# Altium footprint library NASCO 3D PCBLIB.PcbLib: 108 footprints (part 7 of 7)
Each footprint in its own frame and in the unit in brackets; x right, y up, seen from the top. Pads: shape width x height; smd on the part's side, far side on the other; paste and mask are expansions set on the pad; w line width, h text height; cw(c..) or ccw(c..) is an arc to the next point about the centre after c.
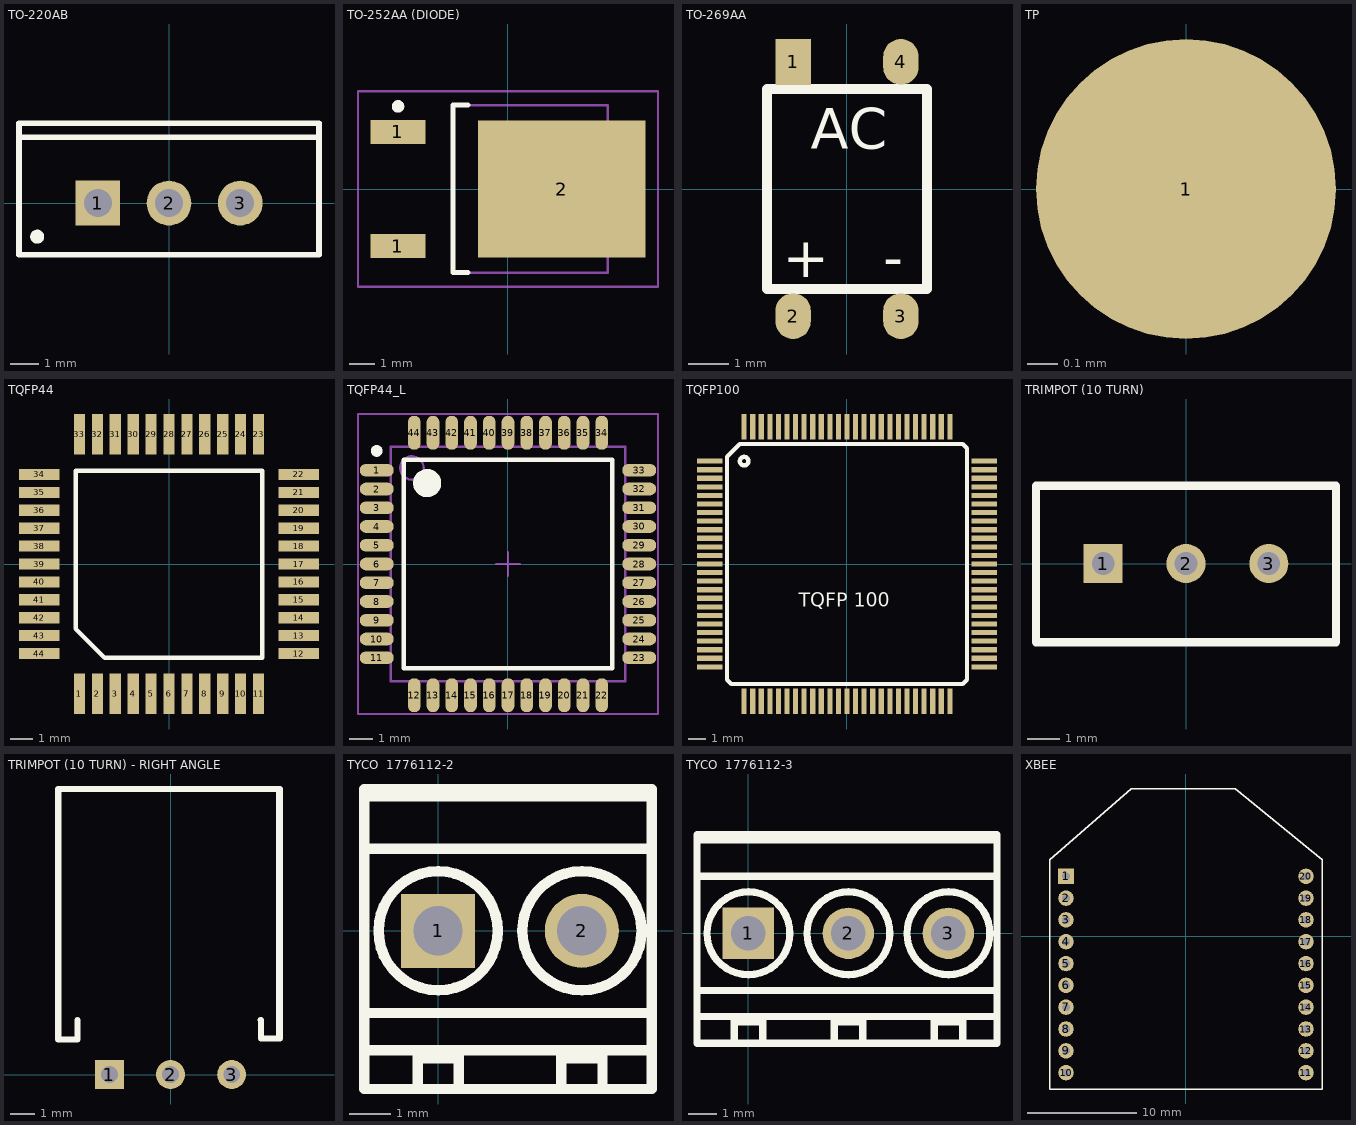
[diagram p6: the footprints below, top view; thin cyan lines are the x and y axes]

## TO-220AB [mm] "TO, Thru-Hole, Vertical, Heatsink Mounted; 3 In-Line Leads; Pitch 2.54 mm"
height 19.3
pads (3):
  rect 1.6x1.6 hole 1: 1(-2.54,0)
  round 1.6 hole 1: 2(0,0) 3(2.54,0)
Top Overlay:
  circle w0.25: c-4.7,-1.2 r0.125
  lines w0.2: -5.35,2.35 5.35,2.35 ; -5.35,-1.85 -5.35,2.85 5.35,2.85 5.35,-1.85 -5.35,-1.85
Mechanical 13:
  lines w0.1: -5.35,-1.85 5.35,-1.85 5.35,2.85 -5.35,2.85 -5.35,-1.85
Mechanical 15:
  lines w0.1: -0.5,0 0.5,0 ; 0,-0.5 0,0.5
3D body "User Library-TO3B_(TO220)_1.step": height 18.42, standoff -9.98, extent -5.193,-1.805 5.207,2.695

## TO-252AA (DIODE) [mm] "D-PAK, 4-Leads, Body 6.1x6.5mm, Pitch 2.28mm, Lead Span 9.8mm, IPC Low Density"
height 2.38
pads (3):
  rect 2.2x0.95 smd: 1(-4.4,-2.28) 1(-4.4,2.28)
  rect 6.7x5.5 smd: 2(2.15,0)
Top Overlay:
  circle w0.25: c-4.4,3.305 r0.125
  lines w0.2: -1.6,-3.35 -2.2,-3.35 -2.2,3.35 -1.6,3.35
Mechanical 13:
  lines w0.1: -2.2,-3.35 4,-3.35 4,3.35 -2.2,3.35 -2.2,-3.35
Mechanical 15:
  lines w0.1: -0.5,0 0.5,0 ; 0,-0.5 0,0.5 ; -6,-3.9 6,-3.9 6,3.9 -6,3.9 -6,-3.9
3D body: height 2.38, standoff 0, extent -2.2,-3.35 4,3.35

## TO-269AA [mil]
pads (4):
  rect 35x45 smd: 1(-53,125)
  oval 35x45 smd: 2(-53,-125) 3(53,-125) 4(53,125)
Top Overlay:
  lines w10: -78.74,-98.43 -78.74,98.43 78.74,98.43 78.74,-98.43 -78.74,-98.43
  text "AC" at -35.43,39.37 h40
  text "+" at -62.99,-86.61 h40
  text "-" at 35.43,-86.61 h40
3D body "TO-269AA.step": height 115.17, standoff 0.6, extent -97.44,-138.58 97.44,138.58

## TP [mm] "Test Point, Single Side, No Hole"
pads (1):
  round 1 smd: 1(0,0)

## TQFP44 [mm]
pads (44):
  rect 0.5x1.8 smd: 1(-4,-5.8) 2(-3.2,-5.8) 3(-2.4,-5.8) 4(-1.6,-5.8) 5(-0.8,-5.8) 6(0,-5.8) 7(0.8,-5.8) 8(1.6,-5.8) 9(2.4,-5.8) 10(3.2,-5.8) 11(4,-5.8) 23(4,5.8) 24(3.2,5.8) 25(2.4,5.8) 26(1.6,5.8) 27(0.8,5.8) 28(0,5.8) 29(-0.8,5.8) 30(-1.6,5.8) 31(-2.4,5.8) 32(-3.2,5.8) 33(-4,5.8)
  rect 1.8x0.5 smd: 12(5.8,-4) 13(5.8,-3.2) 14(5.8,-2.4) 15(5.8,-1.6) 16(5.8,-0.8) 17(5.8,0) 18(5.8,0.8) 19(5.8,1.6) 20(5.8,2.4) 21(5.8,3.2) 22(5.8,4) 34(-5.8,4) 35(-5.8,3.2) 36(-5.8,2.4) 37(-5.8,1.6) 38(-5.8,0.8) 39(-5.8,0) 40(-5.8,-0.8) 41(-5.8,-1.6) 42(-5.8,-2.4) 43(-5.8,-3.2) 44(-5.8,-4)
Top Overlay:
  lines w0.2: -4.175,-2.887 -2.88,-4.182 4.175,-4.182 4.175,4.168 -4.175,4.168 -4.175,-2.887
3D body "User Library-TQFP44.step": height 1.02, standoff -0.05, extent -6.019,-5.983 5.981,6.017

## TQFP44_L [mm] "44-Pin Plastic Thin Quad Flat Pack (TFQP44), IPC High Density"
height 1.2
pads (44):
  oval 1.45x0.55 smd: 1(-5.6,4) 2(-5.6,3.2) 3(-5.6,2.4) 4(-5.6,1.6) 5(-5.6,0.8) 6(-5.6,0) 7(-5.6,-0.8) 8(-5.6,-1.6) 9(-5.6,-2.4) 10(-5.6,-3.2) 11(-5.6,-4) 23(5.6,-4) 24(5.6,-3.2) 25(5.6,-2.4) 26(5.6,-1.6) 27(5.6,-0.8) 28(5.6,0) 29(5.6,0.8) 30(5.6,1.6) 31(5.6,2.4) 32(5.6,3.2) 33(5.6,4)
  oval 0.55x1.45 smd: 12(-4,-5.6) 13(-3.2,-5.6) 14(-2.4,-5.6) 15(-1.6,-5.6) 16(-0.8,-5.6) 17(0,-5.6) 18(0.8,-5.6) 19(1.6,-5.6) 20(2.4,-5.6) 21(3.2,-5.6) 22(4,-5.6) 34(4,5.6) 35(3.2,5.6) 36(2.4,5.6) 37(1.6,5.6) 38(0.8,5.6) 39(0,5.6) 40(-0.8,5.6) 41(-1.6,5.6) 42(-2.4,5.6) 43(-3.2,5.6) 44(-4,5.6)
Top Overlay:
  circle w0.6: c-3.45,3.45 r0.3
  circle w0.25: c-5.6,4.825 r0.125
  lines w0.2: -4.45,-4.45 4.45,-4.45 4.45,4.45 -4.45,4.45 -4.45,-4.45
Mechanical 13:
  circle w0.1: c-4.1,4.1 r0.5
  lines w0.1: -5,-5 5,-5 5,5 -5,5 -5,-5
Mechanical 15:
  lines w0.1: -0.5,0 0.5,0 ; 0,-0.5 0,0.5 ; -6.4,-6.4 6.4,-6.4 6.4,6.4 -6.4,6.4 -6.4,-6.4
3D body: height 1.2, standoff 0, extent -5,-5 5,5

## TQFP100 [mm]
pads (100):
  rect 1.5x0.3 smd: 1(-8,6) 2(-8,5.5) 3(-8,5) 4(-8,4.5) 5(-8,4) 6(-8,3.5) 7(-8,3) 8(-8,2.5) 9(-8,2) 10(-8,1.5) 11(-8,1) 12(-8,0.5) 13(-8,0) 14(-8,-0.5) 15(-8,-1) 16(-8,-1.5) 17(-8,-2) 18(-8,-2.5) 19(-8,-3) 20(-8,-3.5) 21(-8,-4) 22(-8,-4.5) 23(-8,-5) 24(-8,-5.5) 25(-8,-6) 51(8,-6) 52(8,-5.5) 53(8,-5) 54(8,-4.5) 55(8,-4) 56(8,-3.5) 57(8,-3) 58(8,-2.5) 59(8,-2) 60(8,-1.5) 61(8,-1) 62(8,-0.5) 63(8,0) 64(8,0.5) 65(8,1) 66(8,1.5) 67(8,2) 68(8,2.5) 69(8,3) 70(8,3.5) 71(8,4) 72(8,4.5) 73(8,5) 74(8,5.5) 75(8,6)
  rect 0.3x1.5 smd: 26(-6,-8) 27(-5.5,-8) 28(-5,-8) 29(-4.5,-8) 30(-4,-8) 31(-3.5,-8) 32(-3,-8) 33(-2.5,-8) 34(-2,-8) 35(-1.5,-8) 36(-1,-8) 37(-0.5,-8) 38(0,-8) 39(0.5,-8) 40(1,-8) 41(1.5,-8) 42(2,-8) 43(2.5,-8) 44(3,-8) 45(3.5,-8) 46(4,-8) 47(4.5,-8) 48(5,-8) 49(5.5,-8) 50(6,-8) 76(6,8) 77(5.5,8) 78(5,8) 79(4.5,8) 80(4,8) 81(3.5,8) 82(3,8) 83(2.5,8) 84(2,8) 85(1.5,8) 86(1,8) 87(0.5,8) 88(0,8) 89(-0.5,8) 90(-1,8) 91(-1.5,8) 92(-2,8) 93(-2.5,8) 94(-3,8) 95(-3.5,8) 96(-4,8) 97(-4.5,8) 98(-5,8) 99(-5.5,8) 100(-6,8)
Top Overlay:
  circle w0.254: c-6,6 r0.25
  lines w0.254: -7,-6.75 -7,6.25 -6.25,7 6.75,7 7,6.75 7,-6.75 6.75,-7 -6.75,-7 -7,-6.75
  text "TQFP 100" at -2.81,-2.48 h0.81
3D body "User Library-TQFP100-2.step": height 1.1, standoff 0, extent -8.009,-8.009 8.009,8.009

## TRIMPOT (10 TURN) [mm] "Thru-Hole; 3 Leads"
pads (3):
  rect 1.2x1.2 hole 0.7: 1(-2.54,0)
  round 1.2 hole 0.7: 2(0,0) 3(2.54,0)
Top Overlay:
  lines w0.254: -2.54,-2.413 4.597,-2.413 4.6,-2.41 4.6,2.39 -2.517,2.39 ; 2.517,2.39 -4.6,2.39 -4.6,-2.41 -4.597,-2.413 2.54,-2.413
3D body "User Library-Potenciometro Vertical.step": height 12.02, standoff -5.48, extent -4.6,-2.41 4.6,2.39

## TRIMPOT (10 TURN) - RIGHT ANGLE [mm] "Thru-Hole; 3 Leads"
pads (3):
  rect 1.2x1.2 hole 0.7: 1(-2.54,0)
  round 1.2 hole 0.7: 2(0,0) 3(2.54,0)
Top Overlay:
  lines w0.254: -3.863,2.258 -3.863,1.458 -4.663,1.458 -4.663,11.858 4.5,11.858 ; 3.737,2.258 3.75,2.258 3.75,1.5 4.537,1.5 4.537,11.858 4.5,11.858 ; 4.5,1.5 4.5,11.858
3D body "User Library-Potenciometro Vertical.step": height 4.72, standoff -0.08, extent -4.6,-4 4.6,13.5

## TYCO  1776112-2 [mm] "3.5mm Pitch Low Profile Connector (2 Way)"
pads (2):
  rect 1.8x1.8 hole 1.2: 1(0,0)
  round 1.8 hole 1.2: 2(3.5,0)
Top Overlay:
  circle w0.254: c3.502,0 r1.45
  circle w0.254: c0.002,0 r1.45
  lines w0.254: -1.798,-2.91 5.202,-2.91 ; -1.798,-2 5.202,-2 ; -1.798,2 5.202,2 ; -1.798,3.274 5.202,3.274 ; -0.498,-3.85 -0.498,-2.915 0.502,-2.915 0.502,-3.85 ; -0.498,-3.1 0.502,-3.1 ; 3.002,-3.85 3.002,-2.915 4.002,-2.915 4.002,-3.85 ; 3.002,-3.1 4.002,-3.1 ; -1.798,-3.85 -1.798,3.45 5.202,3.45 5.202,-3.85 -1.798,-3.85
3D body "c-1776112-2-o-3d.stp": height 8.55, standoff -3.45, extent -1.771,-3.876 5.229,3.424

## TYCO  1776112-3 [mm] "3.5mm Pitch Low Profile Connector (3 Way)"
pads (3):
  rect 1.8x1.8 hole 1.2: 1(0,0)
  round 1.8 hole 1.2: 2(3.5,0) 3(7,0)
Top Overlay:
  circle w0.254: c0.002,0 r1.45
  circle w0.254: c3.502,0 r1.45
  circle w0.254: c7.002,0 r1.45
  lines w0.254: -1.798,-2.91 5.202,-2.91 8.702,-2.91 8.702,-3 ; -1.798,-2 5.202,-2 8.702,-2 ; -1.798,2 5.202,2 8.702,2 ; -1.798,3.274 5.202,3.274 8.702,3.274 8.702,3.45 ; -0.498,-3.85 -0.498,-2.915 0.502,-2.915 0.502,-3.85 ; -0.498,-3.1 0.502,-3.1 ; 3.002,-3.85 3.002,-2.915 4.002,-2.915 4.002,-3.85 ; 3.002,-3.1 4.002,-3.1 ; 5,-3.85 8.702,-3.85 8.702,3.45 ; 5.202,-3.85 -1.798,-3.85 -1.798,3.45 5.202,3.45 8.702,3.45 ; 6.502,-3.85 6.502,-2.915 7.502,-2.915 7.502,-3.85 ; 6.502,-3.1 7.502,-3.1
3D body "c-1776112-3-o-3d.stp": height 8.55, standoff -3.45, extent -1.8,-3.8 8.7,3.5

## XBEE [mm]
pads (20):
  rect 1.422x1.422 hole 0.7: 1(-11,5.5)
  round 1.422 hole 0.7: 2(-11,3.5) 3(-11,1.5) 4(-11,-0.5) 5(-11,-2.5) 6(-11,-4.5) 7(-11,-6.5) 8(-11,-8.5) 9(-11,-10.5) 10(-11,-12.5) 11(11,-12.5) 12(11,-10.5) 13(11,-8.5) 14(11,-6.5) 15(11,-4.5) 16(11,-2.5) 17(11,-0.5) 18(11,1.5) 19(11,3.5) 20(11,5.5)
Top Overlay:
  lines w0.127: -12.5,-14 12.5,-14 12.5,7 4.5,13.5 -5,13.5 -12.5,7 -12.5,-14
3D body "User Library-XBee-Chip.STEP": height 3.52, standoff -3.98, extent -12.25,-14.622 12.25,13.278